# Altium footprint library 14-Inductors.PcbLib: 164 footprints (part 2 of 11)
Each footprint in its own frame and in the unit in brackets; x right, y up, seen from the top. Pads: shape width x height; smd on the part's side, far side on the other; paste and mask are expansions set on the pad; w line width, h text height; cw(c..) or ccw(c..) is an arc to the next point about the centre after c.
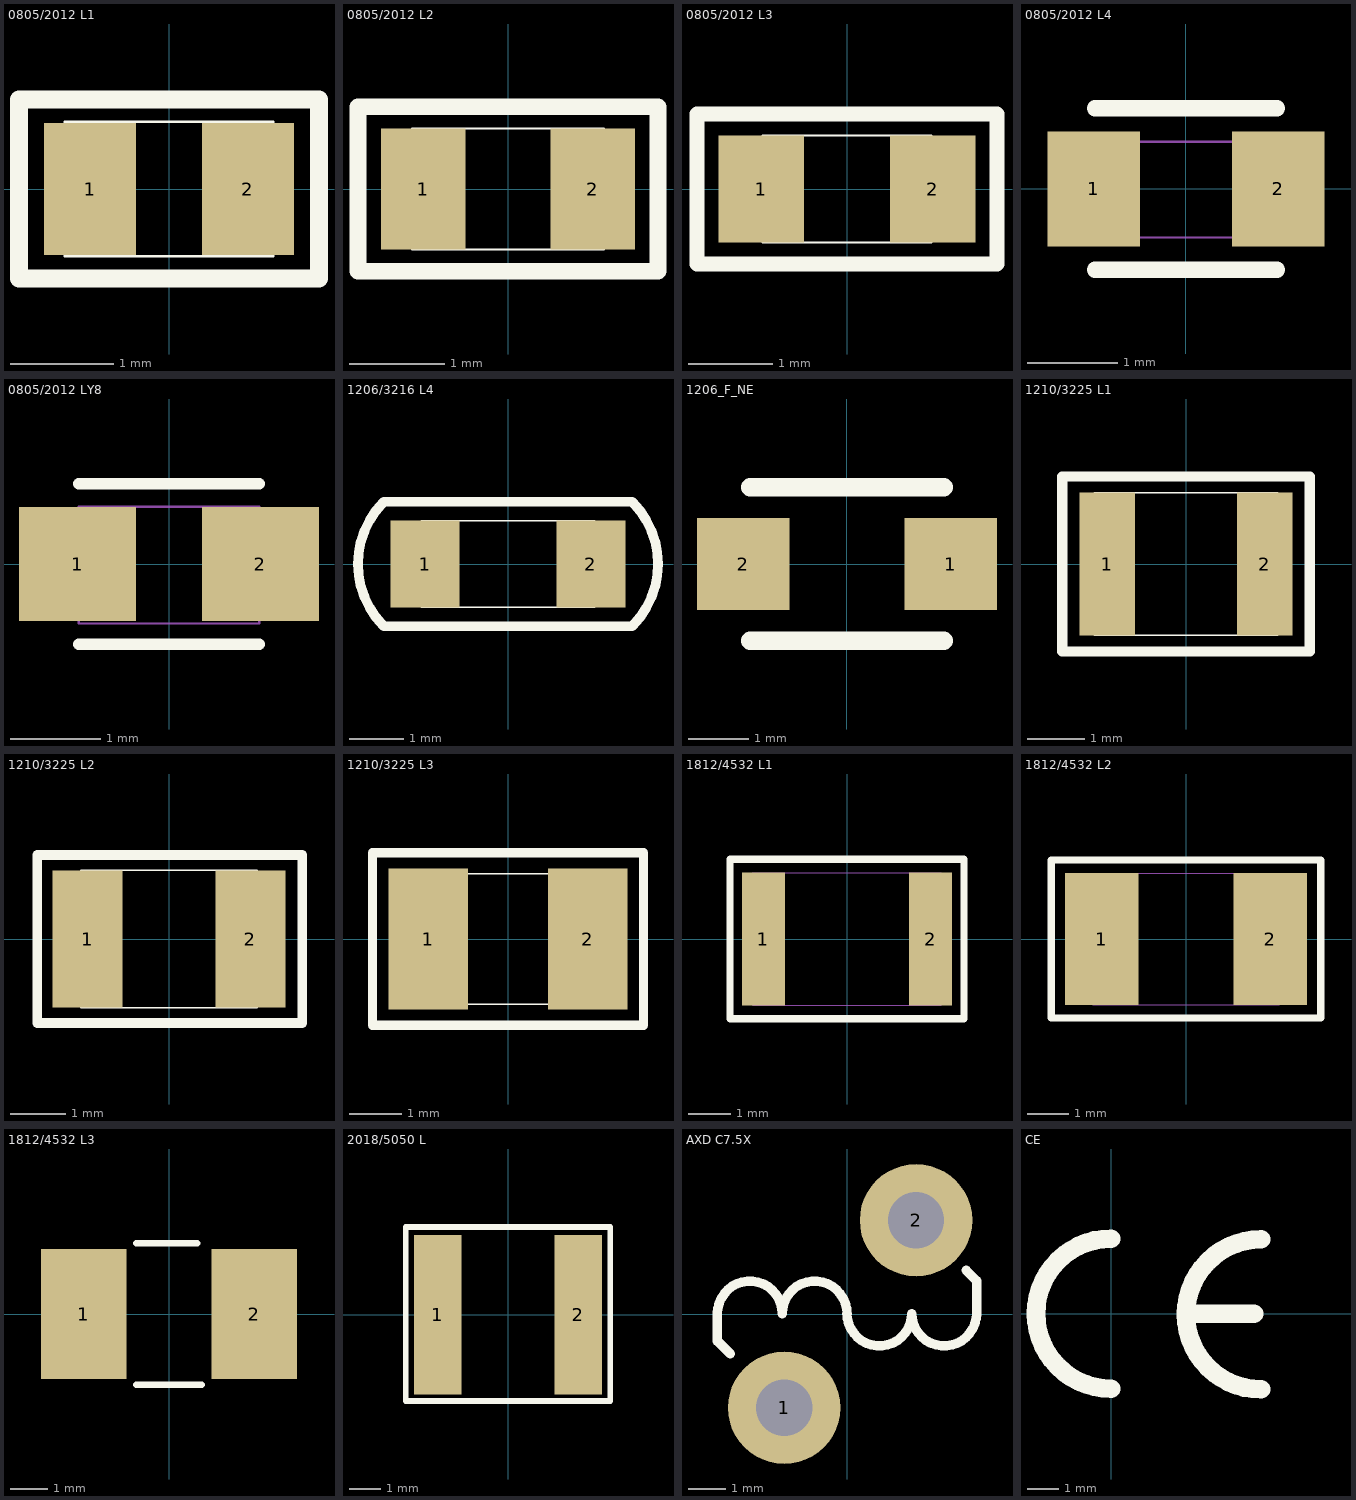
[diagram p1: the footprints below, top view; thin cyan lines are the x and y axes]

## 0805/2012 L1 [mil]
height 31.5
pads (2):
  rect 35x50 smd: 1(-30,0)
  rect 35x50 smd mask+2.76: 2(30,0)
Top Overlay:
  lines w1: -39.5,-25.5 -39.5,25.5 39.5,25.5 39.5,-25.5 -39.5,-25.5
  lines w7: -57,-34 1,-34 57,-34 57,34 -57,34 -57,-34
3D body "0805_1016_127.stp": height 0.39, standoff 0, extent 7.5,-25 47.5,25
3D body "0805_1016_127.stp": height 0.39, standoff 0, extent -47.5,-25 -7.5,25
3D body "0805-l.stp": height 39.37, standoff 0, extent -39.5,-20 39.24,19.37

## 0805/2012 L2 [mil]
height 31.5
pads (2):
  rect 35x50 smd: 1(-35,0)
  rect 35x50 smd mask+2.76: 2(35,0)
Top Overlay:
  lines w1: -39.5,-25 -39.5,25 39.5,25 39.5,-25 -39.5,-25
  lines w7: -62,-34 -62,34 62,34 62,-34 1,-34 -62,-34
3D body "0805_1016_127.stp": height 0.39, standoff 0, extent 12.5,-25 52.5,25
3D body "0805_1016_127.stp": height 0.39, standoff 0, extent -52.5,-25 -12.5,25
3D body "0805-l.stp": height 39.37, standoff 0, extent -39.5,-20 39.24,19.37

## 0805/2012 L3 [mil]
height 31.5
pads (2):
  rect 40x50 smd: 1(-40,0)
  rect 40x50 smd mask+2.76: 2(40,0)
Top Overlay:
  lines w1: -39.5,-25 39.5,-25 39.5,25 -39.5,25 -39.5,-25
  lines w7: -70,-35 -70,35 70,35 70,-35 0,-35 -70,-35
3D body "0805-l.stp": height 39.37, standoff 0, extent -39.5,-20 39.24,19.37
3D body "0805_1016_127.stp": height 0.39, standoff 0, extent 20,-25 60,25
3D body "0805_1016_127.stp": height 0.39, standoff 0, extent -60,-25 -20,25

## 0805/2012 L4 [mil]
height 31.5
pads (2):
  rect 40x50 smd: 1(-40,0)
  rect 40x50 smd mask+2.76: 2(40,0)
Top Overlay:
  lines w7: -39.37,-35 39.37,-35 ; -39.37,35 39.37,35
Mechanical 15:
  lines w1: -39.5,-21 39.5,-21 39.5,20.5 -39.5,20.5 -39.5,-21
3D body "0805-l.stp": height 39.37, standoff 0, extent -39.5,-20 39.24,19.37
3D body "0805_1016_127.stp": height 0.39, standoff 0, extent -60,-25 -20,25
3D body "0805_1016_127.stp": height 0.39, standoff 0, extent 20,-25 60,25

## 0805/2012 LY8 [mm]
height 0.8
pads (2):
  rect 1.3x1.27 smd: 1(-1.016,0)
  rect 1.3x1.27 smd mask+0.07: 2(1.016,0)
Top Overlay:
  lines w0.127: -1,-0.889 1,-0.889 ; -1,0.889 1,0.889
Mechanical 15:
  lines w0.025: -1.003,-0.66 -1.003,0.635 1.003,0.635 1.003,-0.66 -1.003,-0.66
3D body "0805-l.stp": height 1, standoff 0, extent -1.003,-0.508 0.997,0.492
3D body "0805_1016_127.stp": height 0.01, standoff 0, extent 0.635,-0.635 1.651,0.635
3D body "0805_1016_127.stp": height 0.01, standoff 0, extent -1.676,-0.635 -0.66,0.635

## 1206/3216 L4 [mil]
height 31.5
pads (2):
  rect 50x63 smd mask+2.76: 1(-60,0)
  rect 50x63 smd: 2(60,0)
Top Overlay:
  lines w1: -63,-31.5 63,-31.5 63,31.5 -63,31.5 -63,-31.5
  lines w7: -90,-45 90,-45 ; -90,45 90,45
  lines w7.01: -90,-45 cw(c-45,0) -90,45 ; 90,-45 ccw(c45,0) 90,45
3D body "1206-vrt.stp": height 62.99, standoff 0, extent -63,-31.5 62.98,31.49
3D body "1_6-1_27-1206a.stp": height 0.79, standoff 0, extent -85,-31.49 -35,31.5
3D body "1_6-1_27-1206a.stp": height 0.79, standoff 0, extent 35,-31.49 85,31.5

## 1206_F_NE [mil]
height 460.63
pads (2):
  rect 60x60 smd: 1(67.5,0)
  rect 60x60 smd mask+2.76: 2(-67.5,0)
Top Overlay:
  lines w12: -62.99,-50 62.99,-50 ; -62.99,50 62.99,50
3D body "1_524-1_524.stp": height 0.79, standoff 0, extent 37.51,-29.99 97.51,30.01
3D body "1_524-1_524.stp": height 0.79, standoff 0, extent -97.49,-29.99 -37.49,30.01
3D body "1206-322318.stp": height 70.87, standoff -0.79, extent -62.99,-31.49 63,31.5

## 1210/3225 L1 [mil]
height 31.5
pads (2):
  rect 38x98 smd mask+2.76: 1(-54,0)
  rect 38x98 smd: 2(54,0)
Top Overlay:
  lines w1: -63,-49 -63,49 63,49 63,-49 -63,-49
  lines w7: -85,-60 85,-60 85,60 -85,60 -85,-60
3D body "0_965-2_489-1210.stp": height 0.79, standoff 0, extent 35.01,-48.99 73,49
3D body "0_965-2_489-1210.stp": height 0.79, standoff 0, extent -72.99,-48.99 -35,49
3D body "1210-vrt.stp": height 98.43, standoff 0, extent -63,-49 62.98,49.43

## 1210/3225 L2 [mil]
height 31.5
pads (2):
  rect 50x98 smd: 1(-58,0)
  rect 50x98 smd mask+2.76: 2(58,0)
Top Overlay:
  lines w1: -63,-49 -63,49 63,49 63,-49 -63,-49
  lines w7: -94,-60 95,-60 95,60 -94,60 -94,-60
3D body "1_27-2_489-1210a.stp": height 0.79, standoff 0, extent 33,-48.99 83,49
3D body "1_27-2_489-1210a.stp": height 0.79, standoff 0, extent -83,-48.99 -33,49
3D body "1210-vrt.stp": height 98.43, standoff 0, extent -62.99,-49.21 62.99,49.22

## 1210/3225 L3 [mil]
height 31.5
pads (2):
  rect 60x106 smd: 1(-60,0)
  rect 60x106 smd mask+2.76: 2(60,0)
Top Overlay:
  lines w1: -63,-49 -63,49 63,49 63,-49 -63,-49
  lines w7: -102,-65 -102,65 102,65 102,-65 -102,-65
3D body "1_524-2_692-1210c.stp": height 0.79, standoff 0, extent 30,-52.99 90,53
3D body "1_524-2_692-1210c.stp": height 0.79, standoff 0, extent -90,-52.99 -30,53
3D body "1210-vrt.stp": height 98.43, standoff 0, extent -63,-49 62.98,49.43

## 1812/4532 L1 [mil]
height 31.5
pads (2):
  rect 40x125 smd: 1(-78.5,0)
  rect 40x125 smd mask+2.76: 2(78.5,0)
Top Overlay:
  lines w7: -110,-75 -110,75 110,75 110,-75 -110,-75
Mechanical 16:
  lines w1: -88.5,-62.5 88.5,-62.5 88.5,62.5 -88.5,62.5 -88.5,-62.5
3D body "1812-vrt.stp": height 125.98, standoff 0, extent -88.58,-63 88.58,62.98
3D body "3_175-1_016-1812.stp": height 0.79, standoff 0, extent -99,-62.5 -59,62.5
3D body "3_175-1_016-1812.stp": height 0.79, standoff 0, extent 58.5,-62.5 98.5,62.5

## 1812/4532 L2 [mil]
height 31.5
pads (2):
  rect 70x125 smd mask+2.76: 1(-80,0)
  rect 70x125 smd: 2(80,0)
Top Overlay:
  lines w7: -128,-75 -128,75 128,75 128,-75 -128,-75
Mechanical 16:
  lines w1: -88.5,-62.5 88.5,-62.5 88.5,62.5 -88.5,62.5 -88.5,-62.5
3D body "1812-vrt.stp": height 125.98, standoff 0, extent -88.58,-63 88.58,62.98
3D body "3_175-1_778-1812.stp": height 0.79, standoff 0, extent -115,-62.5 -45,62.5
3D body "3_175-1_778-1812.stp": height 0.79, standoff 0, extent 45.5,-62.5 115.5,62.5

## 1812/4532 L3 [mm]
height 0.8
pads (2):
  rect 2.3x3.5 smd: 1(-2.3,0)
  rect 2.3x3.5 smd mask+0.07: 2(2.3,0)
Top Overlay:
  lines w0.178: -0.889,-1.905 0.889,-1.905 ; -0.889,1.905 0.762,1.905
3D body "3_5-2_3-1812.stp": height 0.02, standoff 0, extent 1.161,-1.75 3.461,1.75
3D body "3_5-2_3-1812.stp": height 0.02, standoff 0, extent -3.461,-1.75 -1.161,1.75
3D body "1812-vrt.stp": height 3.2, standoff 0, extent -2.25,-1.6 2.25,1.6

## 2018/5050 L [mil]
height 31.5
pads (2):
  rect 60x200 smd: 1(-88,0)
  rect 60x200 smd mask+2.76: 2(88,0)
Top Overlay:
  lines w7: -128,-108 128,-108 128,110 -128,110 -128,-108
3D body "2018-L.stp": height 118.11, standoff 0, extent -98.43,-99 98.43,97.85

## AXD C7.5X [mm]
height 0.8
pads (2):
  round 3 hole 1.5: 1(-1.676,-2.5)
  round 3 hole 1.5 mask+0.07: 2(1.841,2.5)
Top Overlay:
  lines w0.254: -3.111,-1.066 -3.454,-0.722 -3.454,0.013 cw(c-2.591,0.013) -1.727,0.013 cw(c-0.864,0.013) 0,0.013 ccw(c0.864,0.013) 1.727,0.013 ccw(c2.591,0.013) 3.454,0.013 3.454,0.887 3.18,1.161
3D body "LL.stp": height 11.4, standoff -4, extent -6.472,-6.668 6.356,4.75

## CE [mm]
Top Overlay:
  lines w0.6: 0,-2.413 cw(c0,0) 0,2.413 ; 2.53,0 4.6,0 ; 4.826,-2.438 cw(c4.826,-0.025) 4.826,2.388
3D body "ce.stp": height 0.02, standoff 0, extent -2.725,-2.725 4.82,2.725